# Altium footprint library 6-Connectors-3.PcbLib: 153 footprints (part 10 of 11) (continued)
## WAGO_236-404/000-009 [mm] "16A 250VAC 4 Way PCB Terminal Block, Pitch 5mm, CAGE CLAMP?Connection, Wire Size Max: 2.5mm²" (continued)
Mechanical 8:
  lines w0.1: -8.6,-3.756 -7.6,-3.756 ; -8.6,1.244 -7.6,1.244 ; -7.6,-4.756 -7.6,-3.756 ; -7.6,-2.756 -7.6,-3.756 ; -7.6,0.244 -7.6,1.244 ; -7.6,2.244 -7.6,1.244 ; -6.6,-3.756 -7.6,-3.756 ; -6.6,1.244 -7.6,1.244 ; -3.6,-3.756 -2.6,-3.756 ; -3.6,1.244 -2.6,1.244 ; -2.6,-4.756 -2.6,-3.756 ; -2.6,-2.756 -2.6,-3.756 ; -2.6,0.244 -2.6,1.244 ; -2.6,2.244 -2.6,1.244 ; -1.6,-3.756 -2.6,-3.756 ; -1.6,1.244 -2.6,1.244 ; -1,0 1,0 ; 0,-1 0,1 ; 1.4,-3.756 2.4,-3.756 ; 1.4,1.244 2.4,1.244 ; 2.4,-4.756 2.4,-3.756 ; 2.4,-2.756 2.4,-3.756 ; 2.4,0.244 2.4,1.244 ; 2.4,2.244 2.4,1.244 ; 3.4,-3.756 2.4,-3.756 ; 3.4,1.244 2.4,1.244 ; 6.4,-3.756 7.4,-3.756 ; 6.4,1.244 7.4,1.244 ; 7.4,-4.756 7.4,-3.756 ; 7.4,-2.756 7.4,-3.756 ; 7.4,0.244 7.4,1.244 ; 7.4,2.244 7.4,1.244 ; 8.4,-3.756 7.4,-3.756 ; 8.4,1.244 7.4,1.244
Mechanical 14:
  lines w0.1: -10.5,-6.596 -11.1,-6.596 -11.1,-5.396 -10.5,-5.396 ; -10.5,-2.766 -11.1,-2.766 -11.1,-1.166 -10.5,-1.166 ; -10.5,-0.486 10.5,-0.486 ; -10.5,1.504 10.5,1.504 ; -10.5,2.325 -11.1,2.325 -11.1,3.925 -10.5,3.925 ; -10.5,4.649 -11.1,4.649 -11.1,5.844 -10.5,5.844 ; -9.5,-4.193 -9.063,-4.193 ; -8.8,-2.001 -5.2,-2.001 ; -8.8,-1.047 -5.2,-1.047 ; -8.6,-4.193 -8.6,-5.501 ; -7.815,2.701 -7.815,4.893 ccw(c-8.315,4.936) -8.108,5.393 ccw(c-9.052,3.479) -8.815,5.6 ; -7.815,4.54 -6.585,4.54 ; -6.585,2.701 -6.585,4.893 cw(c-6.085,4.936) -6.292,5.393 cw(c-5.348,3.479) -5.585,5.6 ; -6.15,-4.193 -6.15,-5.501 ; -3.8,-2.001 -0.2,-2.001 ; -3.8,-1.047 -0.2,-1.047 ; -3.6,-4.193 -3.6,-5.501 ; -2.815,2.701 -2.815,4.893 ccw(c-3.315,4.936) -3.108,5.393 ccw(c-4.052,3.479) -3.815,5.6 ; -2.815,4.54 -1.585,4.54 ; -1.585,2.701 -1.585,4.893 cw(c-1.085,4.936) -1.292,5.393 cw(c-0.348,3.479) -0.585,5.6 ; -1.15,-4.193 -1.15,-5.501 ; 0.006,-4.193 0.1,-4.299 ; 0.938,-4.193 0.9,-4.299 ; 1.2,-2.001 4.8,-2.001 ; 1.2,-1.047 4.8,-1.047 ; 1.4,-4.193 1.4,-5.501 ; 2.185,2.701 2.185,4.893 ccw(c1.685,4.936) 1.892,5.393 ccw(c0.948,3.479) 1.185,5.6 ; 2.185,4.54 3.415,4.54 ; 3.415,2.701 3.415,4.893 cw(c3.915,4.936) 3.708,5.393 cw(c4.652,3.479) 4.415,5.6 ; 3.85,-4.193 3.85,-5.501 ; 5.006,-4.193 5.1,-4.299 ; 5.938,-4.193 5.9,-4.299 ; 6.2,-2.001 9.8,-2.001 ; 6.2,-1.047 9.8,-1.047 ; 6.4,-4.193 6.4,-5.501 ; 7.185,2.701 7.185,4.893 ccw(c6.685,4.936) 6.892,5.393 ccw(c5.948,3.479) 6.185,5.6 ; 7.185,4.54 8.415,4.54 ; 8.415,2.701 8.415,4.893 cw(c8.915,4.936) 8.708,5.393 cw(c9.652,3.479) 9.415,5.6 ; 8.85,-4.193 8.85,-5.501 ; 10.006,-4.193 10.1,-4.299 ; 10.5,-7.842 -10.5,-7.842 -10.5,6.244 10.5,6.244 10.5,-7.828 ; 10.5,-4.299 10.1,-4.299 ; 10.5,-4.193 -9.063,-4.193 ; 10.5,-3.224 11.2,-3.224 11.2,0.156 10.5,0.156 ; 10.5,-2.107 9.8,-2.107 9.8,-0.552 6.2,-0.552 6.2,-2.107 4.8,-2.107 4.8,-0.552 1.2,-0.552 1.2,-2.107 -0.2,-2.107 -0.2,-0.552 -3.8,-0.552 -3.8,-2.107 -5.2,-2.107 -5.2,-0.552 -8.8,-0.552 -8.8,-2.107 -9.5,-2.107 -9.5,-4.299 -9.1,-4.299 ; -9.1,-7.487 -8.6,-5.501 ; -9.1,-7.487 -4.9,-7.487 ; -9.1,-7.487 -9.1,-4.299 ; -9.1,-4.299 -9.063,-4.193 ; -8.815,5.6 -8.815,2.701 -5.585,2.701 -5.585,5.6 ; -8.815,5.6 -5.585,5.6 ; -8.6,-5.501 -6.15,-5.501 ; -6.15,-5.501 -4.9,-7.487 ; -4.9,-7.487 -4.9,-4.299 ; -4.9,-4.299 -4.1,-4.299 ; -4.9,-4.299 -4.994,-4.193 -4.063,-4.193 -4.1,-4.299 ; -4.1,-7.487 -3.6,-5.501 ; -4.1,-7.487 0.1,-7.487 ; -4.1,-7.487 -4.1,-4.299 ; -3.815,5.6 -3.815,2.701 -0.585,2.701 -0.585,5.6 ; -3.815,5.6 -0.585,5.6 ; -3.6,-5.501 -1.15,-5.501 ; -1.15,-5.501 0.1,-7.487 ; 0.1,-7.487 0.1,-4.299 ; 0.1,-4.299 0.9,-4.299 ; 0.9,-7.487 1.4,-5.501 ; 0.9,-7.487 5.1,-7.487 ; 0.9,-7.487 0.9,-4.299 ; 1.185,5.6 1.185,2.701 4.415,2.701 4.415,5.6 ; 1.185,5.6 4.415,5.6 ; 1.4,-5.501 3.85,-5.501 ; 3.85,-5.501 5.1,-7.487 ; 5.1,-7.487 5.1,-4.299 ; 5.1,-4.299 5.9,-4.299 ; 5.9,-7.487 6.4,-5.501 ; 5.9,-7.487 10.1,-7.487 ; 5.9,-7.487 5.9,-4.299 ; 6.185,5.6 6.185,2.701 9.415,2.701 9.415,5.6 ; 6.185,5.6 9.415,5.6 ; 6.4,-5.501 8.85,-5.501 ; 8.85,-5.501 10.1,-7.487 ; 10.1,-7.487 10.1,-4.299 ; -10.5,0 10.5,0 -10.5,0
3D body "WAGO_236-404-009.stp": height 12.71, standoff -4, extent -11.1,-7.841 11.2,6.244

## WEIDMULLER_1146320000 [mm] "24A 400 V, Pitch 5.08mm, 2 Positions PCB Male Header, Type SL 5.08HC Serie"
height 12
pads (2):
  round 2.1 hole 1.4: 1(-2.54,0) 2(2.54,0)
Top Overlay:
  lines w0.2: -4.98,-2.26 -4.694,-2.26 ccw(c-2.54,0.24) -0.386,-2.26 0.386,-2.26 ccw(c2.54,0.24) 4.694,-2.26 4.98,-2.26 ; -4.98,3.06 4.98,3.06 ; -3.46,3.06 -3.46,3.323 -3.71,3.68 -3.71,3.88 -1.37,3.88 -1.37,3.68 -1.62,3.323 -1.62,3.06 ; 1.62,3.06 1.62,3.323 1.37,3.68 1.37,3.88 3.71,3.88 3.71,3.68 3.46,3.323 3.46,3.06 ; -4.98,-3.8 -4.98,4.63 4.98,4.63 4.98,-3.8 -4.98,-3.8
  text "2" at 2.2,1.6 h1
  text "1" at -2.675,1.6 h1
Mechanical 8:
  lines w0.1: -3.04,0 -2.54,0 ; -2.54,-0.5 -2.54,0 ; -2.54,0.5 -2.54,0 ; -2.04,0 -2.54,0 ; -0.5,0 0,0 ; 0,-0.5 0,0 ; 0,0.5 0,0 ; 0.5,0 0,0 ; 2.04,0 2.54,0 ; 2.54,-0.5 2.54,0 ; 2.54,0.5 2.54,0 ; 3.04,0 2.54,0
Mechanical 14:
  lines w0.1: -4.98,-2.26 -4.694,-2.26 ccw(c-2.54,0.24) -0.386,-2.26 0.386,-2.26 ccw(c2.54,0.24) 4.694,-2.26 4.98,-2.26 ; -4.98,3.06 4.98,3.06 ; -3.46,3.06 -3.46,3.323 -3.71,3.68 -3.71,3.88 -1.37,3.88 -1.37,3.68 -1.62,3.323 -1.62,3.06 ; 1.62,3.06 1.62,3.323 1.37,3.68 1.37,3.88 3.71,3.88 3.71,3.68 3.46,3.323 3.46,3.06 ; -4.98,-3.8 -4.98,4.63 4.98,4.63 4.98,-3.8 -4.98,-3.8 ; -3.04,-0.332 -3.04,0.332 -2.872,0.5 -2.208,0.5 -2.04,0.332 -2.04,-0.332 -2.2,-0.494 -2.872,-0.5 -3.04,-0.332 ; 2.04,-0.332 2.04,0.332 2.208,0.5 2.872,0.5 3.04,0.332 3.04,-0.332 2.88,-0.494 2.208,-0.5 2.04,-0.332
  text "1" at -2.675,1.6 h1
  text "2" at 2.2,1.6 h1
3D body "WEIDMULLER_1146320000.stp": height 12, standoff -3.2, extent -4.98,-3.8 4.98,4.63

## WEIDMULLER_1146340000 [mm] "24A 400 V, Pitch 5.08mm, 3 Positions PCB Male Header, Type SL 5.08HC Serie"
height 12
pads (3):
  round 2.1 hole 1.4: 1(-5.08,0) 2(0,0) 3(5.08,0)
Top Overlay:
  lines w0.2: -7.52,-2.26 -7.234,-2.26 ccw(c-5.08,0.24) -2.926,-2.26 -2.154,-2.26 ccw(c0,0.24) 2.154,-2.26 2.926,-2.26 ccw(c5.08,0.24) 7.234,-2.26 7.52,-2.26 ; -7.52,3.06 7.52,3.06 ; -6,3.06 -6,3.323 -6.25,3.68 -6.25,3.88 -3.91,3.88 -3.91,3.68 -4.16,3.323 -4.16,3.06 ; -0.92,3.06 -0.92,3.323 -1.17,3.68 -1.17,3.88 1.17,3.88 1.17,3.68 0.92,3.323 0.92,3.06 ; 4.16,3.06 4.16,3.323 3.91,3.68 3.91,3.88 6.25,3.88 6.25,3.68 6,3.323 6,3.06 ; -7.52,-3.8 7.52,-3.8 7.52,4.63 -7.52,4.63 -7.52,-3.8
  text "3" at 4.74,1.6 h1
  text "1" at -5.215,1.6 h1
  text "2" at -0.34,1.6 h1
Mechanical 8:
  lines w0.1: -5.58,0 -5.08,0 ; -5.08,-0.5 -5.08,0 ; -5.08,0.5 -5.08,0 ; -4.58,0 -5.08,0 ; 4.58,0 5.08,0 ; 5.08,-0.5 5.08,0 ; 5.08,0.5 5.08,0 ; 5.58,0 5.08,0 ; 0,0 -0.5,0 0,0 ; 0,0 0,-0.5 0,0 ; 0,0 0.5,0 0,0 ; 0,0 0,0.5 0,0
Mechanical 14:
  lines w0.1: -7.52,-2.26 -7.234,-2.26 ccw(c-5.08,0.24) -2.926,-2.26 -2.154,-2.26 ccw(c0,0.24) 2.154,-2.26 2.926,-2.26 ccw(c5.08,0.24) 7.234,-2.26 7.52,-2.26 ; -7.52,3.06 7.52,3.06 ; -6,3.06 -6,3.323 -6.25,3.68 -6.25,3.88 -3.91,3.88 -3.91,3.68 -4.16,3.323 -4.16,3.06 ; -0.92,3.06 -0.92,3.323 -1.17,3.68 -1.17,3.88 1.17,3.88 1.17,3.68 0.92,3.323 0.92,3.06 ; 4.16,3.06 4.16,3.323 3.91,3.68 3.91,3.88 6.25,3.88 6.25,3.68 6,3.323 6,3.06 ; -7.52,-3.8 7.52,-3.8 7.52,4.63 -7.52,4.63 -7.52,-3.8 ; -5.58,-0.332 -5.412,-0.5 -4.74,-0.494 -4.58,-0.332 -4.58,0.332 -4.748,0.5 -5.412,0.5 -5.58,0.332 -5.58,-0.332 ; -0.5,-0.332 -0.332,-0.5 0.34,-0.494 0.5,-0.332 0.5,0.332 0.332,0.5 -0.332,0.5 -0.5,0.332 -0.5,-0.332 ; 4.58,-0.332 4.748,-0.5 5.42,-0.494 5.58,-0.332 5.58,0.332 5.412,0.5 4.748,0.5 4.58,0.332 4.58,-0.332
  text "3" at 4.74,1.6 h1
  text "2" at -0.34,1.6 h1
  text "1" at -5.215,1.6 h1
3D body "WEIDMULLER_1146340000.stp": height 12, standoff -3.2, extent -7.52,-3.8 7.52,4.63

## WEIDMULLER_1146380000 [mm] "24A 400 V, Pitch 5.08mm, 4 Positions PCB Male Header, Type SL 5.08HC Serie"
height 12
pads (4):
  round 2.1 hole 1.4: 1(-7.62,0) 2(-2.54,0) 3(2.54,0) 4(7.62,0)
Top Overlay:
  lines w0.2: -10.06,-2.26 -9.774,-2.26 ccw(c-7.62,0.24) -5.466,-2.26 -4.694,-2.26 ccw(c-2.54,0.24) -0.386,-2.26 0.386,-2.26 ccw(c2.54,0.24) 4.694,-2.26 5.466,-2.26 ccw(c7.62,0.24) 9.774,-2.26 10.06,-2.26 ; -10.06,3.06 10.06,3.06 ; -8.54,3.06 -8.54,3.323 -8.79,3.68 -8.79,3.88 -6.45,3.88 -6.45,3.68 -6.7,3.323 -6.7,3.06 ; -3.46,3.06 -3.46,3.323 -3.71,3.68 -3.71,3.88 -1.37,3.88 -1.37,3.68 -1.62,3.323 -1.62,3.06 ; 1.62,3.06 1.62,3.323 1.37,3.68 1.37,3.88 3.71,3.88 3.71,3.68 3.46,3.323 3.46,3.06 ; 6.7,3.06 6.7,3.323 6.45,3.68 6.45,3.88 8.79,3.88 8.79,3.68 8.54,3.323 8.54,3.06 ; -10.06,-3.8 10.06,-3.8 10.06,4.63 -10.06,4.63 -10.06,-3.8
  text "4" at 7.28,1.6 h1
  text "3" at 2.2,1.6 h1
  text "1" at -7.755,1.6 h1
  text "2" at -2.88,1.6 h1
Mechanical 8:
  lines w0.1: -8.12,0 -7.62,0 ; -7.62,-0.5 -7.62,0 ; -7.62,0.5 -7.62,0 ; -7.12,0 -7.62,0 ; 7.12,0 7.62,0 ; 7.62,-0.5 7.62,0 ; 7.62,0.5 7.62,0 ; 8.12,0 7.62,0 ; -2.54,0 -3.04,0 -2.54,0 ; -2.54,0 -2.54,-0.5 -2.54,0 ; -2.54,0 -2.04,0 -2.54,0 ; -2.54,0 -2.54,0.5 -2.54,0 ; 0,0 -0.5,0 0,0 ; 0,0 0,-0.5 0,0 ; 0,0 0.5,0 0,0 ; 0,0 0,0.5 0,0 ; 2.54,0 2.04,0 2.54,0 ; 2.54,0 2.54,-0.5 2.54,0 ; 2.54,0 3.04,0 2.54,0 ; 2.54,0 2.54,0.5 2.54,0
Mechanical 14:
  lines w0.1: -10.06,-2.26 -9.774,-2.26 ccw(c-7.62,0.24) -5.466,-2.26 -4.694,-2.26 ccw(c-2.54,0.24) -0.386,-2.26 0.386,-2.26 ccw(c2.54,0.24) 4.694,-2.26 5.466,-2.26 ccw(c7.62,0.24) 9.774,-2.26 10.06,-2.26 ; -10.06,3.06 10.06,3.06 ; -8.54,3.06 -8.54,3.323 -8.79,3.68 -8.79,3.88 -6.45,3.88 -6.45,3.68 -6.7,3.323 -6.7,3.06 ; -3.46,3.06 -3.46,3.323 -3.71,3.68 -3.71,3.88 -1.37,3.88 -1.37,3.68 -1.62,3.323 -1.62,3.06 ; 1.62,3.06 1.62,3.323 1.37,3.68 1.37,3.88 3.71,3.88 3.71,3.68 3.46,3.323 3.46,3.06 ; 6.7,3.06 6.7,3.323 6.45,3.68 6.45,3.88 8.79,3.88 8.79,3.68 8.54,3.323 8.54,3.06 ; -10.06,-3.8 10.06,-3.8 10.06,4.63 -10.06,4.63 -10.06,-3.8 ; -8.12,-0.332 -7.952,-0.5 -7.28,-0.494 -7.12,-0.332 -7.12,0.332 -7.288,0.5 -7.952,0.5 -8.12,0.332 -8.12,-0.332 ; -3.04,-0.332 -2.872,-0.5 -2.2,-0.494 -2.04,-0.332 -2.04,0.332 -2.208,0.5 -2.872,0.5 -3.04,0.332 -3.04,-0.332 ; 2.04,-0.332 2.208,-0.5 2.88,-0.494 3.04,-0.332 3.04,0.332 2.872,0.5 2.208,0.5 2.04,0.332 2.04,-0.332 ; 7.12,-0.332 7.288,-0.5 7.96,-0.494 8.12,-0.332 8.12,0.332 7.952,0.5 7.288,0.5 7.12,0.332 7.12,-0.332
  text "4" at 7.28,1.6 h1
  text "3" at 2.2,1.6 h1
  text "2" at -2.88,1.6 h1
  text "1" at -7.755,1.6 h1
3D body "WEIDMULLER_1146380000.stp": height 12, standoff -3.2, extent -10.06,-3.8 10.06,4.63

## WEIDMULLER_1146410000 [mm] "24A 400 V, Pitch 5.08mm, 5 Positions PCB Male Header, Type SL 5.08HC Serie"
height 12
pads (5):
  round 2.1 hole 1.4: 1(-10.16,0) 2(-5.08,0) 3(0,0) 4(5.08,0) 5(10.16,0)
Top Overlay:
  lines w0.2: -12.6,-2.26 -12.314,-2.26 ccw(c-10.16,0.24) -8.006,-2.26 -7.234,-2.26 ccw(c-5.08,0.24) -2.926,-2.26 -2.154,-2.26 ccw(c0,0.24) 2.154,-2.26 2.926,-2.26 ccw(c5.08,0.24) 7.234,-2.26 8.006,-2.26 ccw(c10.16,0.24) 12.314,-2.26 12.6,-2.26 ; -12.6,3.06 12.6,3.06 ; -11.08,3.06 -11.08,3.323 -11.33,3.68 -11.33,3.88 -8.99,3.88 -8.99,3.68 -9.24,3.323 -9.24,3.06 ; -6,3.06 -6,3.323 -6.25,3.68 -6.25,3.88 -3.91,3.88 -3.91,3.68 -4.16,3.323 -4.16,3.06 ; -0.92,3.06 -0.92,3.323 -1.17,3.68 -1.17,3.88 1.17,3.88 1.17,3.68 0.92,3.323 0.92,3.06 ; 4.16,3.06 4.16,3.323 3.91,3.68 3.91,3.88 6.25,3.88 6.25,3.68 6,3.323 6,3.06 ; 9.24,3.06 9.24,3.323 8.99,3.68 8.99,3.88 11.33,3.88 11.33,3.68 11.08,3.323 11.08,3.06 ; -12.6,-3.8 12.6,-3.8 12.6,4.63 -12.6,4.63 -12.6,-3.8
  text "5" at 9.82,1.6 h1
  text "4" at 4.74,1.6 h1
  text "2" at -5.42,1.6 h1
  text "1" at -10.295,1.6 h1
  text "3" at -0.34,1.6 h1
Mechanical 8:
  lines w0.1: -10.66,0 -10.16,0 ; -10.16,-0.5 -10.16,0 ; -10.16,0.5 -10.16,0 ; -9.66,0 -10.16,0 ; 9.66,0 10.16,0 ; 10.16,-0.5 10.16,0 ; 10.16,0.5 10.16,0 ; 10.66,0 10.16,0 ; -5.08,0 -5.58,0 -5.08,0 ; -5.08,0 -5.08,-0.5 -5.08,0 ; -5.08,0 -4.58,0 -5.08,0 ; -5.08,0 -5.08,0.5 -5.08,0 ; -0.5,0 0,0 ; -0.5,0 0,0 ; -0.5,0 0,0 ; -0.5,0 0,0 ; 0,-0.5 0,0 ; 0,-0.5 0,0 ; 0,-0.5 0,0 ; 0,-0.5 0,0 ; 0,0 0.5,0 ; 0,0 0,0.5 ; 0,0 0.5,0 ; 0,0 0,0.5 ; 0,0 0.5,0 ; 0,0 0,0.5 ; 0,0 0.5,0 ; 0,0 0,0.5 ; 5.08,0 4.58,0 5.08,0 ; 5.08,0 5.08,-0.5 5.08,0 ; 5.08,0 5.58,0 5.08,0 ; 5.08,0 5.08,0.5 5.08,0
Mechanical 14:
  lines w0.1: -12.6,-2.26 -12.314,-2.26 ccw(c-10.16,0.24) -8.006,-2.26 -7.234,-2.26 ccw(c-5.08,0.24) -2.926,-2.26 -2.154,-2.26 ccw(c0,0.24) 2.154,-2.26 2.926,-2.26 ccw(c5.08,0.24) 7.234,-2.26 8.006,-2.26 ccw(c10.16,0.24) 12.314,-2.26 12.6,-2.26 ; -12.6,3.06 12.6,3.06 ; -11.08,3.06 -11.08,3.323 -11.33,3.68 -11.33,3.88 -8.99,3.88 -8.99,3.68 -9.24,3.323 -9.24,3.06 ; -6,3.06 -6,3.323 -6.25,3.68 -6.25,3.88 -3.91,3.88 -3.91,3.68 -4.16,3.323 -4.16,3.06 ; -0.92,3.06 -0.92,3.323 -1.17,3.68 -1.17,3.88 1.17,3.88 1.17,3.68 0.92,3.323 0.92,3.06 ; 4.16,3.06 4.16,3.323 3.91,3.68 3.91,3.88 6.25,3.88 6.25,3.68 6,3.323 6,3.06 ; 9.24,3.06 9.24,3.323 8.99,3.68 8.99,3.88 11.33,3.88 11.33,3.68 11.08,3.323 11.08,3.06 ; -12.6,-3.8 12.6,-3.8 12.6,4.63 -12.6,4.63 -12.6,-3.8 ; -10.66,-0.332 -10.492,-0.5 -9.82,-0.494 -9.66,-0.332 -9.66,0.332 -9.828,0.5 -10.492,0.5 -10.66,0.332 -10.66,-0.332 ; -5.58,-0.332 -5.412,-0.5 -4.74,-0.494 -4.58,-0.332 -4.58,0.332 -4.748,0.5 -5.412,0.5 -5.58,0.332 -5.58,-0.332 ; -0.5,-0.332 -0.332,-0.5 0.34,-0.494 0.5,-0.332 0.5,0.332 0.332,0.5 -0.332,0.5 -0.5,0.332 -0.5,-0.332 ; 4.58,-0.332 4.748,-0.5 5.42,-0.494 5.58,-0.332 5.58,0.332 5.412,0.5 4.748,0.5 4.58,0.332 4.58,-0.332 ; 9.66,-0.332 9.828,-0.5 10.5,-0.494 10.66,-0.332 10.66,0.332 10.492,0.5 9.828,0.5 9.66,0.332 9.66,-0.332
  text "5" at 9.82,1.6 h1
  text "4" at 4.74,1.6 h1
  text "1" at -10.295,1.6 h1
  text "2" at -5.42,1.6 h1
  text "3" at -0.34,1.6 h1
3D body "WEIDMULLER_1146410000.stp": height 12, standoff -3.2, extent -12.6,-3.8 12.6,4.63

## WEIDMULLER_1146450000 [mm] "24A 400 V, Pitch 5.08mm, 6 Positions PCB Male Header, Type SL 5.08HC Serie"
height 12
pads (6):
  round 2.1 hole 1.4: 1(-12.7,0) 2(-7.62,0) 3(-2.54,0) 4(2.54,0) 5(7.62,0) 6(12.7,0)
Top Overlay:
  lines w0.2: -15.14,-2.26 -14.854,-2.26 ccw(c-12.7,0.24) -10.546,-2.26 -9.774,-2.26 ccw(c-7.62,0.24) -5.466,-2.26 -4.694,-2.26 ccw(c-2.54,0.24) -0.386,-2.26 0.386,-2.26 ccw(c2.54,0.24) 4.694,-2.26 5.466,-2.26 ccw(c7.62,0.24) 9.774,-2.26 10.546,-2.26 ccw(c12.7,0.24) 14.854,-2.26 15.14,-2.26 ; -15.14,3.06 15.14,3.06 ; -13.62,3.06 -13.62,3.323 -13.87,3.68 -13.87,3.88 -11.53,3.88 -11.53,3.68 -11.78,3.323 -11.78,3.06 ; -8.54,3.06 -8.54,3.323 -8.79,3.68 -8.79,3.88 -6.45,3.88 -6.45,3.68 -6.7,3.323 -6.7,3.06 ; -3.46,3.06 -3.46,3.323 -3.71,3.68 -3.71,3.88 -1.37,3.88 -1.37,3.68 -1.62,3.323 -1.62,3.06 ; 1.62,3.06 1.62,3.323 1.37,3.68 1.37,3.88 3.71,3.88 3.71,3.68 3.46,3.323 3.46,3.06 ; 6.7,3.06 6.7,3.323 6.45,3.68 6.45,3.88 8.79,3.88 8.79,3.68 8.54,3.323 8.54,3.06 ; 11.78,3.06 11.78,3.323 11.53,3.68 11.53,3.88 13.87,3.88 13.87,3.68 13.62,3.323 13.62,3.06 ; -15.14,-3.8 -15.14,4.63 15.14,4.63 15.14,-3.8 -15.14,-3.8
  text "3" at -2.88,1.6 h1
  text "1" at -12.835,1.6 h1
  text "2" at -7.96,1.6 h1
  text "4" at 2.2,1.6 h1
  text "5" at 7.28,1.6 h1
  text "6" at 12.36,1.6 h1
Mechanical 8:
  lines w0.1: -13.2,0 -12.7,0 ; -12.7,-0.5 -12.7,0 ; -12.7,0.5 -12.7,0 ; -12.2,0 -12.7,0 ; 7.12,0 7.62,0 ; 7.62,-0.5 7.62,0 ; 7.62,0.5 7.62,0 ; 8.12,0 7.62,0 ; 12.2,0 12.7,0 ; 12.7,-0.5 12.7,0 ; 12.7,0.5 12.7,0 ; 13.2,0 12.7,0 ; -7.62,0 -7.62,0.5 -7.62,0 ; -7.62,0 -7.12,0 -7.62,0 ; -7.62,0 -7.62,-0.5 -7.62,0 ; -7.62,0 -8.12,0 -7.62,0 ; -3.04,0 -2.54,0 ; -3.04,0 -2.54,0 ; -3.04,0 -2.54,0 ; -3.04,0 -2.54,0 ; -3.04,0 -2.54,0 ; -3.04,0 -2.54,0 ; -3.04,0 -2.54,0 ; -3.04,0 -2.54,0 ; -2.54,-0.5 -2.54,0 ; -2.54,-0.5 -2.54,0 ; -2.54,-0.5 -2.54,0 ; -2.54,-0.5 -2.54,0 ; -2.54,-0.5 -2.54,0 ; -2.54,-0.5 -2.54,0 ; -2.54,-0.5 -2.54,0 ; -2.54,-0.5 -2.54,0 ; -2.54,0 -2.54,0.5 ; -2.54,0 -2.04,0 ; -2.54,0 -2.54,0.5 ; -2.54,0 -2.04,0 ; -2.54,0 -2.54,0.5 ; -2.54,0 -2.04,0 ; -2.54,0 -2.54,0.5 ; -2.54,0 -2.04,0 ; -2.54,0 -2.54,0.5 ; -2.54,0 -2.04,0 ; -2.54,0 -2.54,0.5 ; -2.54,0 -2.04,0 ; -2.54,0 -2.54,0.5 ; -2.54,0 -2.04,0 ; -2.54,0 -2.54,0.5 ; -2.54,0 -2.04,0 ; 2.54,0 2.54,0.5 2.54,0 ; 2.54,0 3.04,0 2.54,0 ; 2.54,0 2.54,-0.5 2.54,0 ; 2.54,0 2.04,0 2.54,0
Mechanical 14:
  lines w0.1: -15.14,-2.26 -14.854,-2.26 ccw(c-12.7,0.24) -10.546,-2.26 -9.774,-2.26 ccw(c-7.62,0.24) -5.466,-2.26 -4.694,-2.26 ccw(c-2.54,0.24) -0.386,-2.26 0.386,-2.26 ccw(c2.54,0.24) 4.694,-2.26 5.466,-2.26 ccw(c7.62,0.24) 9.774,-2.26 10.546,-2.26 ccw(c12.7,0.24) 14.854,-2.26 15.14,-2.26 ; -15.14,3.06 15.14,3.06 ; -13.62,3.06 -13.62,3.323 -13.87,3.68 -13.87,3.88 -11.53,3.88 -11.53,3.68 -11.78,3.323 -11.78,3.06 ; -8.54,3.06 -8.54,3.323 -8.79,3.68 -8.79,3.88 -6.45,3.88 -6.45,3.68 -6.7,3.323 -6.7,3.06 ; -3.46,3.06 -3.46,3.323 -3.71,3.68 -3.71,3.88 -1.37,3.88 -1.37,3.68 -1.62,3.323 -1.62,3.06 ; 1.62,3.06 1.62,3.323 1.37,3.68 1.37,3.88 3.71,3.88 3.71,3.68 3.46,3.323 3.46,3.06 ; 6.7,3.06 6.7,3.323 6.45,3.68 6.45,3.88 8.79,3.88 8.79,3.68 8.54,3.323 8.54,3.06 ; 11.78,3.06 11.78,3.323 11.53,3.68 11.53,3.88 13.87,3.88 13.87,3.68 13.62,3.323 13.62,3.06 ; -15.14,-3.8 -15.14,4.63 15.14,4.63 15.14,-3.8 -15.14,-3.8 ; -13.2,-0.332 -13.2,0.332 -13.032,0.5 -12.368,0.5 -12.2,0.332 -12.2,-0.332 -12.36,-0.494 -13.032,-0.5 -13.2,-0.332 ; -8.12,-0.332 -8.12,0.332 -7.952,0.5 -7.288,0.5 -7.12,0.332 -7.12,-0.332 -7.28,-0.494 -7.952,-0.5 -8.12,-0.332 ; -3.04,-0.332 -3.04,0.332 -2.872,0.5 -2.208,0.5 -2.04,0.332 -2.04,-0.332 -2.2,-0.494 -2.872,-0.5 -3.04,-0.332 ; 2.04,-0.332 2.04,0.332 2.208,0.5 2.872,0.5 3.04,0.332 3.04,-0.332 2.88,-0.494 2.208,-0.5 2.04,-0.332 ; 7.12,-0.332 7.12,0.332 7.288,0.5 7.952,0.5 8.12,0.332 8.12,-0.332 7.96,-0.494 7.288,-0.5 7.12,-0.332 ; 12.2,-0.332 12.2,0.332 12.368,0.5 13.032,0.5 13.2,0.332 13.2,-0.332 13.04,-0.494 12.368,-0.5 12.2,-0.332
  text "3" at -2.88,1.6 h1
  text "2" at -7.96,1.6 h1
  text "1" at -12.835,1.6 h1
  text "4" at 2.2,1.6 h1
  text "5" at 7.28,1.6 h1
  text "6" at 12.36,1.6 h1
3D body "WEIDMULLER_1146450000.stp": height 12, standoff -3.2, extent -15.14,-3.8 15.14,4.63

## WEIDMULLER_1146490000 [mm] "24A 400 V, Pitch 5.08mm, 8 Positions PCB Male Header, Type SL 5.08HC Serie"
height 12
pads (8):
  round 2.1 hole 1.4: 1(-17.78,0) 2(-12.7,0) 3(-7.62,0) 4(-2.54,0) 5(2.54,0) 6(7.62,0) 7(12.7,0) 8(17.78,0)
Top Overlay:
  lines w0.2: -20.22,-2.26 -19.934,-2.26 ccw(c-17.78,0.24) -15.626,-2.26 -14.854,-2.26 ccw(c-12.7,0.24) -10.546,-2.26 -9.774,-2.26 ccw(c-7.62,0.24) -5.466,-2.26 -4.694,-2.26 ccw(c-2.54,0.24) -0.386,-2.26 0.386,-2.26 ccw(c2.54,0.24) 4.694,-2.26 5.466,-2.26 ccw(c7.62,0.24) 9.774,-2.26 10.546,-2.26 ccw(c12.7,0.24) 14.854,-2.26 15.626,-2.26 ccw(c17.78,0.24) 19.934,-2.26 20.22,-2.26 ; -20.22,3.06 20.22,3.06 ; -18.7,3.06 -18.7,3.323 -18.95,3.68 -18.95,3.88 -16.61,3.88 -16.61,3.68 -16.86,3.323 -16.86,3.06 ; -13.62,3.06 -13.62,3.323 -13.87,3.68 -13.87,3.88 -11.53,3.88 -11.53,3.68 -11.78,3.323 -11.78,3.06 ; -8.54,3.06 -8.54,3.323 -8.79,3.68 -8.79,3.88 -6.45,3.88 -6.45,3.68 -6.7,3.323 -6.7,3.06 ; -3.46,3.06 -3.46,3.323 -3.71,3.68 -3.71,3.88 -1.37,3.88 -1.37,3.68 -1.62,3.323 -1.62,3.06 ; 1.62,3.06 1.62,3.323 1.37,3.68 1.37,3.88 3.71,3.88 3.71,3.68 3.46,3.323 3.46,3.06 ; 6.7,3.06 6.7,3.323 6.45,3.68 6.45,3.88 8.79,3.88 8.79,3.68 8.54,3.323 8.54,3.06 ; 11.78,3.06 11.78,3.323 11.53,3.68 11.53,3.88 13.87,3.88 13.87,3.68 13.62,3.323 13.62,3.06 ; 16.86,3.06 16.86,3.323 16.61,3.68 16.61,3.88 18.95,3.88 18.95,3.68 18.7,3.323 18.7,3.06 ; -20.22,-3.8 -20.22,4.63 20.22,4.63 20.22,-3.8 -20.22,-3.8
  text "6" at 7.28,1.6 h1
  text "5" at 2.2,1.6 h1
  text "4" at -2.88,1.6 h1
  text "2" at -13.04,1.6 h1
  text "1" at -17.915,1.6 h1
  text "3" at -7.96,1.6 h1
  text "7" at 12.36,1.6 h1
  text "8" at 17.44,1.6 h1
Mechanical 8:
  lines w0.1: -18.28,0 -17.78,0 ; -17.78,-0.5 -17.78,0 ; -17.78,0.5 -17.78,0 ; -17.28,0 -17.78,0 ; 2.04,0 2.54,0 ; 2.54,-0.5 2.54,0 ; 2.54,0.5 2.54,0 ; 3.04,0 2.54,0 ; 7.12,0 7.62,0 ; 7.62,-0.5 7.62,0 ; 7.62,0.5 7.62,0 ; 8.12,0 7.62,0 ; 12.2,0 12.7,0 ; 12.7,-0.5 12.7,0 ; 12.7,0.5 12.7,0 ; 13.2,0 12.7,0 ; 17.28,0 17.78,0 ; 17.78,-0.5 17.78,0 ; 17.78,0.5 17.78,0 ; 18.28,0 17.78,0 ; -12.7,0 -12.7,0.5 -12.7,0 ; -12.7,0 -12.2,0 -12.7,0 ; -12.7,0 -12.7,-0.5 -12.7,0 ; -12.7,0 -13.2,0 -12.7,0 ; -8.12,0 -7.62,0 ; -8.12,0 -7.62,0 ; -8.12,0 -7.62,0 ; -8.12,0 -7.62,0 ; -7.62,-0.5 -7.62,0 ; -7.62,-0.5 -7.62,0 ; -7.62,-0.5 -7.62,0 ; -7.62,-0.5 -7.62,0 ; -7.62,0 -7.62,0.5 ; -7.62,0 -7.12,0 ; -7.62,0 -7.62,0.5 ; -7.62,0 -7.12,0 ; -7.62,0 -7.62,0.5 ; -7.62,0 -7.12,0 ; -7.62,0 -7.62,0.5 ; -7.62,0 -7.12,0 ; -2.54,0 -2.54,0.5 -2.54,0 ; -2.54,0 -2.04,0 -2.54,0 ; -2.54,0 -2.54,-0.5 -2.54,0 ; -2.54,0 -3.04,0 -2.54,0 ; -0.5,0 0,0 ; -0.5,0 0,0 ; -0.5,0 0,0 ; -0.5,0 0,0 ; 0,-0.5 0,0 ; 0,-0.5 0,0 ; 0,-0.5 0,0 ; 0,-0.5 0,0 ; 0,0 0,0.5 ; 0,0 0.5,0 ; 0,0 0,0.5 ; 0,0 0.5,0 ; 0,0 0,0.5 ; 0,0 0.5,0 ; 0,0 0,0.5 ; 0,0 0.5,0
Mechanical 14:
  lines w0.1: -20.22,-2.26 -19.934,-2.26 ccw(c-17.78,0.24) -15.626,-2.26 -14.854,-2.26 ccw(c-12.7,0.24) -10.546,-2.26 -9.774,-2.26 ccw(c-7.62,0.24) -5.466,-2.26 -4.694,-2.26 ccw(c-2.54,0.24) -0.386,-2.26 0.386,-2.26 ccw(c2.54,0.24) 4.694,-2.26 5.466,-2.26 ccw(c7.62,0.24) 9.774,-2.26 10.546,-2.26 ccw(c12.7,0.24) 14.854,-2.26 15.626,-2.26 ccw(c17.78,0.24) 19.934,-2.26 20.22,-2.26 ; -20.22,3.06 20.22,3.06 ; -18.7,3.06 -18.7,3.323 -18.95,3.68 -18.95,3.88 -16.61,3.88 -16.61,3.68 -16.86,3.323 -16.86,3.06 ; -13.62,3.06 -13.62,3.323 -13.87,3.68 -13.87,3.88 -11.53,3.88 -11.53,3.68 -11.78,3.323 -11.78,3.06 ; -8.54,3.06 -8.54,3.323 -8.79,3.68 -8.79,3.88 -6.45,3.88 -6.45,3.68 -6.7,3.323 -6.7,3.06 ; -3.46,3.06 -3.46,3.323 -3.71,3.68 -3.71,3.88 -1.37,3.88 -1.37,3.68 -1.62,3.323 -1.62,3.06 ; 1.62,3.06 1.62,3.323 1.37,3.68 1.37,3.88 3.71,3.88 3.71,3.68 3.46,3.323 3.46,3.06 ; 6.7,3.06 6.7,3.323 6.45,3.68 6.45,3.88 8.79,3.88 8.79,3.68 8.54,3.323 8.54,3.06 ; 11.78,3.06 11.78,3.323 11.53,3.68 11.53,3.88 13.87,3.88 13.87,3.68 13.62,3.323 13.62,3.06 ; 16.86,3.06 16.86,3.323 16.61,3.68 16.61,3.88 18.95,3.88 18.95,3.68 18.7,3.323 18.7,3.06 ; -20.22,-3.8 -20.22,4.63 20.22,4.63 20.22,-3.8 -20.22,-3.8 ; -18.28,-0.332 -18.28,0.332 -18.112,0.5 -17.448,0.5 -17.28,0.332 -17.28,-0.332 -17.44,-0.494 -18.112,-0.5 -18.28,-0.332 ; -13.2,-0.332 -13.2,0.332 -13.032,0.5 -12.368,0.5 -12.2,0.332 -12.2,-0.332 -12.36,-0.494 -13.032,-0.5 -13.2,-0.332 ; -8.12,-0.332 -8.12,0.332 -7.952,0.5 -7.288,0.5 -7.12,0.332 -7.12,-0.332 -7.28,-0.494 -7.952,-0.5 -8.12,-0.332 ; -3.04,-0.332 -3.04,0.332 -2.872,0.5 -2.208,0.5 -2.04,0.332 -2.04,-0.332 -2.2,-0.494 -2.872,-0.5 -3.04,-0.332 ; 2.04,-0.332 2.04,0.332 2.208,0.5 2.872,0.5 3.04,0.332 3.04,-0.332 2.88,-0.494 2.208,-0.5 2.04,-0.332 ; 7.12,-0.332 7.12,0.332 7.288,0.5 7.952,0.5 8.12,0.332 8.12,-0.332 7.96,-0.494 7.288,-0.5 7.12,-0.332 ; 12.2,-0.332 12.2,0.332 12.368,0.5 13.032,0.5 13.2,0.332 13.2,-0.332 13.04,-0.494 12.368,-0.5 12.2,-0.332 ; 17.28,-0.332 17.28,0.332 17.448,0.5 18.112,0.5 18.28,0.332 18.28,-0.332 18.12,-0.494 17.448,-0.5 17.28,-0.332
  text "6" at 7.28,1.6 h1
  text "5" at 2.2,1.6 h1
  text "4" at -2.88,1.6 h1
  text "1" at -17.915,1.6 h1
  text "2" at -13.04,1.6 h1
  text "3" at -7.96,1.6 h1
  text "7" at 12.36,1.6 h1
  text "8" at 17.44,1.6 h1
3D body "WEIDMULLER_1146490000.stp": height 12, standoff -3.2, extent -20.22,-3.8 20.22,4.63

## WEIDMULLER_1146530000 [mm] "24A 400 V, Pitch 5.08mm, 10 Positions PCB Male Header, Type SL 5.08HC Serie"
height 12
pads (10):
  round 2.1 hole 1.4: 1(-22.86,0) 2(-17.78,0) 3(-12.7,0) 4(-7.62,0) 5(-2.54,0) 6(2.54,0) 7(7.62,0) 8(12.7,0) 9(17.78,0) 10(22.86,0)
Top Overlay:
  lines w0.2: -25.3,-2.26 -25.014,-2.26 ccw(c-22.86,0.24) -20.706,-2.26 -19.934,-2.26 ccw(c-17.78,0.24) -15.626,-2.26 -14.854,-2.26 ccw(c-12.7,0.24) -10.546,-2.26 -9.774,-2.26 ccw(c-7.62,0.24) -5.466,-2.26 -4.694,-2.26 ccw(c-2.54,0.24) -0.386,-2.26 0.386,-2.26 ccw(c2.54,0.24) 4.694,-2.26 5.466,-2.26 ccw(c7.62,0.24) 9.774,-2.26 10.546,-2.26 ccw(c12.7,0.24) 14.854,-2.26 15.626,-2.26 ccw(c17.78,0.24) 19.934,-2.26 20.706,-2.26 ccw(c22.86,0.24) 25.014,-2.26 25.3,-2.26 ; -25.3,3.06 25.28,3.06 ; -23.78,3.06 -23.78,3.323 -24.03,3.68 -24.03,3.88 -21.69,3.88 -21.69,3.68 -21.94,3.323 -21.94,3.06 ; -18.7,3.06 -18.7,3.323 -18.95,3.68 -18.95,3.88 -16.61,3.88 -16.61,3.68 -16.86,3.323 -16.86,3.06 ; -13.62,3.06 -13.62,3.323 -13.87,3.68 -13.87,3.88 -11.53,3.88 -11.53,3.68 -11.78,3.323 -11.78,3.06 ; -8.54,3.06 -8.54,3.323 -8.79,3.68 -8.79,3.88 -6.45,3.88 -6.45,3.68 -6.7,3.323 -6.7,3.06 ; -3.46,3.06 -3.46,3.323 -3.71,3.68 -3.71,3.88 -1.37,3.88 -1.37,3.68 -1.62,3.323 -1.62,3.06 ; 1.62,3.06 1.62,3.323 1.37,3.68 1.37,3.88 3.71,3.88 3.71,3.68 3.46,3.323 3.46,3.06 ; 6.7,3.06 6.7,3.323 6.45,3.68 6.45,3.88 8.79,3.88 8.79,3.68 8.54,3.323 8.54,3.06 ; 11.78,3.06 11.78,3.323 11.53,3.68 11.53,3.88 13.87,3.88 13.87,3.68 13.62,3.323 13.62,3.06 ; 16.86,3.06 16.86,3.323 16.61,3.68 16.61,3.88 18.95,3.88 18.95,3.68 18.7,3.323 18.7,3.06 ; 21.94,3.06 21.94,3.323 21.69,3.68 21.69,3.88 24.03,3.88 24.03,3.68 23.78,3.323 23.78,3.06 ; -25.3,-3.8 -25.3,4.63 25.3,4.63 25.3,-3.8 -25.3,-3.8
  text "6" at 2.2,1.6 h1
  text "5" at -2.88,1.6 h1
  text "4" at -7.96,1.6 h1
  text "2" at -18.12,1.6 h1
  text "1" at -22.995,1.6 h1
  text "3" at -13.04,1.6 h1
  text "7" at 7.28,1.6 h1
  text "8" at 12.36,1.6 h1
  text "10" at 22.12,1.6 h1
  text "9" at 17.44,1.6 h1
Mechanical 14:
  drawing of 176 lines, arcs and shapes, not listed
  text "6" at 2.2,1.6 h1
  text "5" at -2.88,1.6 h1
  text "4" at -7.96,1.6 h1
  text "1" at -22.995,1.6 h1
  text "2" at -18.12,1.6 h1
  text "3" at -13.04,1.6 h1
  text "7" at 7.28,1.6 h1
  text "8" at 12.36,1.6 h1
  text "10" at 22.12,1.6 h1
  text "9" at 17.44,1.6 h1
3D body "WEIDMULLER_1146530000.stp": height 12, standoff -3.2, extent -25.3,-3.8 25.3,4.63